# Altium footprint library Wurth_Elektronik_Electromechanic_Wire_to_Board_Connectors_rev16a.PCBLIB: 662 footprints (part 31 of 42)
Each footprint in its own frame and in the unit in brackets; x right, y up, seen from the top. Pads: shape width x height; smd on the part's side, far side on the other; paste and mask are expansions set on the pad; w line width, h text height; cw(c..) or ccw(c..) is an arc to the next point about the centre after c.
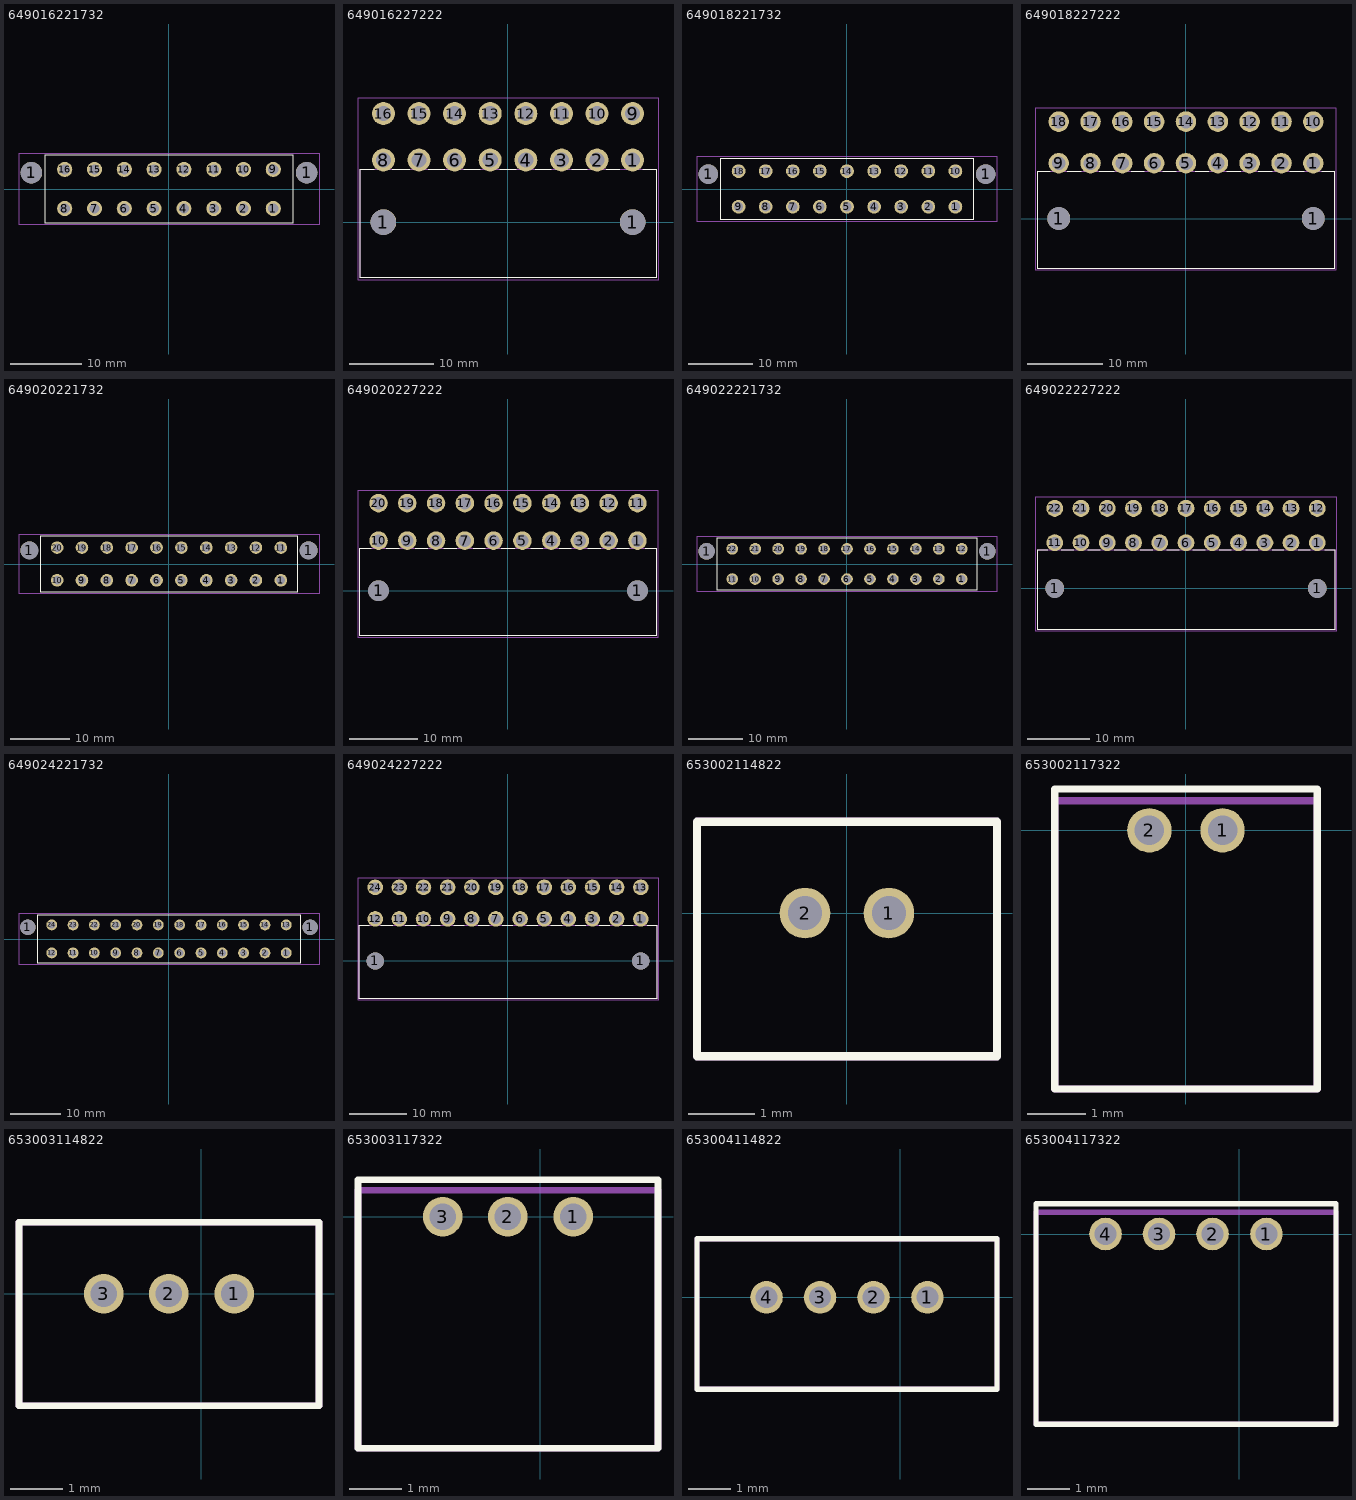
[diagram p30: the footprints below, top view; thin cyan lines are the x and y axes]

## 649016221732 [mil]
pads (18):
  round 119 hole 119: 1(-763.78,91) 1(764,91)
  round 84 hole 56: 1(579,-108.27) 2(414,-108.27) 3(249,-108.27) 4(83,-108.27) 5(-82.68,-108.27) 6(-248.03,-108.27) 7(-413.39,-108.27) 8(-578.74,-108.27) 9(579,109) 10(414,109) 11(249,109) 12(83,109) 13(-82.68,109) 14(-248.03,109) 15(-413.39,109) 16(-578.74,109)
Top Overlay:
  lines w5: -687.01,-188.98 688,-188.98 688,189 -687.01,189 -687.01,-188.98
Mechanical 2:
  text ">NAME" at -54.53,217 h77.5
Mechanical 4:
  text ">VALUE" at -79.53,-249.8 h77.5
Mechanical 16:
  text "1" at 554,-125 h77.5
  text "16" at -611.61,85 h77.5
Mechanical 27:
  lines w5: -832.68,-198.82 833,-198.82 833,199 -832.68,199 -832.68,-198.82

## 649016227222 [mil]
pads (18):
  round 119 hole 119: 1(-578.74,0) 1(579,0)
  round 106.5 hole 71: 1(579,288) 2(414,288) 3(249,288) 4(83,288) 5(-82.68,288) 6(-248.03,288) 7(-413.39,288) 8(-578.74,288) 9(579,504) 10(414,504) 11(249,504) 12(83,504) 13(-82.68,504) 14(-248.03,504) 15(-413.39,504) 16(-578.74,504)
Top Overlay:
  lines w5: -622.05,245 -687.01,245 -687.01,-259.84 688,-259.84 688,245 626,245 ; -537.4,245 -456.69,245 ; -370.08,245 -293.31,245 ; -204.72,245 -129.92,245 ; -37.4,245 38,245 ; 126,245 201,245 ; 296,245 369,245 ; 457,245 520,245
Mechanical 2:
  text ">NAME" at -973.33,-13.19 h77.5
Mechanical 4:
  text ">VALUE" at -998.33,-92.62 h77.5
Mechanical 16:
  lines w5: -687.01,-259.84 688,-259.84 688,245 -687.01,245 -687.01,-259.84
  text "16" at -610.24,471 h77.5
  text "1" at 574,264 h77.5
Mechanical 27:
  lines w5: -696.85,-269.69 697,-269.69 697,577 -696.85,577 -696.85,-269.69

## 649018221732 [mil]
pads (20):
  round 119 hole 119: 1(-846.46,91) 1(847,91)
  round 84 hole 56: 1(662,-108.27) 2(497,-108.27) 3(331,-108.27) 4(166,-108.27) 5(0,-108.27) 6(-165.35,-108.27) 7(-330.71,-108.27) 8(-496.06,-108.27) 9(-661.42,-108.27) 10(662,109) 11(497,109) 12(331,109) 13(166,109) 14(0,109) 15(-165.35,109) 16(-330.71,109) 17(-496.06,109) 18(-661.42,109)
Top Overlay:
  lines w5: -769.68,-188.98 770,-188.98 770,189 -769.68,189 -769.68,-188.98
Mechanical 2:
  text ">NAME" at -171.85,217 h77.5
Mechanical 4:
  text ">VALUE" at -171.85,-274.8 h77.5
Mechanical 16:
  text "1" at 637,-125 h77.5
  text "18" at -713.58,75 h77.5
Mechanical 27:
  lines w5: -915.35,-198.82 916,-198.82 916,199 -915.35,199 -915.35,-198.82

## 649018227222 [mil]
pads (20):
  round 119 hole 119: 1(-661.42,0) 1(662,0)
  round 106.5 hole 71: 1(662,288) 2(497,288) 3(331,288) 4(166,288) 5(0,288) 6(-165.35,288) 7(-330.71,288) 8(-496.06,288) 9(-661.42,288) 10(662,504) 11(497,504) 12(331,504) 13(166,504) 14(0,504) 15(-165.35,504) 16(-330.71,504) 17(-496.06,504) 18(-661.42,504)
Top Overlay:
  lines w5: -704.72,245 -769.68,245 -769.68,-259.84 770,-259.84 770,245 707,245 ; -618.11,245 -543.31,245 ; -450.79,245 -374.02,245 ; -285.43,245 -216.54,245 ; -120.08,245 -49.21,245 ; 48,245 119,245 ; 213,245 284,245 ; 376,245 449,245 ; 540,245 615,245
Mechanical 2:
  text ">NAME" at -1090.65,12 h77.5
Mechanical 4:
  text ">VALUE" at -1090.65,-92.62 h77.5
Mechanical 16:
  lines w5: -769.68,-259.84 770,-259.84 770,245 -769.68,245 -769.68,-259.84
  text "18" at -721.85,471 h77.5
  text "1" at 657,264 h77.5
Mechanical 27:
  lines w5: -779.53,-269.69 780,-269.69 780,577 -779.53,577 -779.53,-269.69

## 649020221732 [mil]
pads (22):
  round 119 hole 119: 1(-929.13,91) 1(930,91)
  round 84 hole 56: 1(745,-108.27) 2(579,-108.27) 3(414,-108.27) 4(249,-108.27) 5(83,-108.27) 6(-82.68,-108.27) 7(-248.03,-108.27) 8(-413.39,-108.27) 9(-578.74,-108.27) 10(-744.09,-108.27) 11(745,109) 12(579,109) 13(414,109) 14(249,109) 15(83,109) 16(-82.68,109) 17(-248.03,109) 18(-413.39,109) 19(-578.74,109) 20(-744.09,109)
Top Overlay:
  lines w5: -852.36,-188.98 853,-188.98 853,189 -852.36,189 -852.36,-188.98
Mechanical 2:
  text ">NAME" at -89.17,217 h77.5
Mechanical 4:
  text ">VALUE" at -89.17,-274.8 h77.5
Mechanical 16:
  text "1" at 720,-125 h77.5
  text "20" at -780.91,75 h77.5
Mechanical 27:
  lines w5: -998.03,-198.82 999,-198.82 999,199 -998.03,199 -998.03,-198.82

## 649020227222 [mil]
pads (22):
  round 119 hole 119: 1(-744.09,0) 1(745,0)
  round 106.5 hole 71: 1(745,288) 2(579,288) 3(414,288) 4(249,288) 5(83,288) 6(-82.68,288) 7(-248.03,288) 8(-413.39,288) 9(-578.74,288) 10(-744.09,288) 11(745,504) 12(579,504) 13(414,504) 14(249,504) 15(83,504) 16(-82.68,504) 17(-248.03,504) 18(-413.39,504) 19(-578.74,504) 20(-744.09,504)
Top Overlay:
  lines w5: -785.43,245 -852.36,245 -852.36,-259.84 853,-259.84 853,245 790,245 ; -698.82,245 -624.02,245 ; -533.46,245 -460.63,245 ; -370.08,245 -293.31,245 ; -200.79,245 -129.92,245 ; -37.4,245 38,245 ; 130,245 199,245 ; 296,245 365,245 ; 459,245 534,245 ; 626,245 697,245
Mechanical 2:
  text ">NAME" at -1232.97,-13.19 h77.5
Mechanical 4:
  text ">VALUE" at -1232.97,-92.62 h77.5
Mechanical 16:
  lines w5: -852.36,-259.84 853,-259.84 853,245 -852.36,245 -852.36,-259.84
  text "20" at -764.17,471 h77.5
  text "1" at 739,264 h77.5
Mechanical 27:
  lines w5: -862.2,-269.69 863,-269.69 863,577 -862.2,577 -862.2,-269.69

## 649022221732 [mil]
pads (24):
  round 119 hole 119: 1(-1011.81,91) 1(1012,91)
  round 84 hole 56: 1(827,-108.27) 2(662,-108.27) 3(497,-108.27) 4(331,-108.27) 5(166,-108.27) 6(0,-108.27) 7(-165.35,-108.27) 8(-330.71,-108.27) 9(-496.06,-108.27) 10(-661.42,-108.27) 11(-826.77,-108.27) 12(827,109) 13(662,109) 14(497,109) 15(331,109) 16(166,109) 17(0,109) 18(-165.35,109) 19(-330.71,109) 20(-496.06,109) 21(-661.42,109) 22(-826.77,109)
Top Overlay:
  lines w5: -935.04,-188.98 936,-188.98 936,189 -935.04,189 -935.04,-188.98
Mechanical 2:
  text ">NAME" at -6.5,217 h77.5
Mechanical 4:
  text ">VALUE" at -6.5,-274.8 h77.5
Mechanical 16:
  text "1" at 802,-125 h77.5
  text "22" at -873.23,75 h77.5
Mechanical 27:
  lines w5: -1080.71,-198.82 1081,-198.82 1081,199 -1080.71,199 -1080.71,-198.82

## 649022227222 [mil]
pads (24):
  round 119 hole 119: 1(-826.77,0) 1(827,0)
  round 106.5 hole 71: 1(827,288) 2(662,288) 3(497,288) 4(331,288) 5(166,288) 6(0,288) 7(-165.35,288) 8(-330.71,288) 9(-496.06,288) 10(-661.42,288) 11(-826.77,288) 12(827,504) 13(662,504) 14(497,504) 15(331,504) 16(166,504) 17(0,504) 18(-165.35,504) 19(-330.71,504) 20(-496.06,504) 21(-661.42,504) 22(-826.77,504)
Top Overlay:
  lines w5: -870.08,245 -935.04,245 -935.04,-259.84 936,-259.84 936,245 873,245 ; -785.43,245 -706.69,245 ; -618.11,245 -539.37,245 ; -452.76,245 -375.98,245 ; -287.4,245 -208.66,245 ; -122.05,245 -43.31,245 ; 44,245 121,245 ; 209,245 286,245 ; 375,245 451,245 ; 542,245 617,245 ; 707,245 782,245
Mechanical 2:
  text ">NAME" at -1250.3,12 h77.5
Mechanical 4:
  text ">VALUE" at -1250.3,-67.62 h77.5
Mechanical 16:
  lines w5: -935.04,-259.84 936,-259.84 936,245 -935.04,245 -935.04,-259.84
  text "22" at -881.5,496 h77.5
  text "1" at 822,264 h77.5
Mechanical 27:
  lines w5: -944.88,-269.69 945,-269.69 945,577 -944.88,577 -944.88,-269.69

## 649024221732 [mil]
pads (26):
  round 119 hole 119: 1(-1094.49,91) 1(1095,91)
  round 84 hole 56: 1(910,-108.27) 2(745,-108.27) 3(579,-108.27) 4(414,-108.27) 5(249,-108.27) 6(83,-108.27) 7(-82.68,-108.27) 8(-248.03,-108.27) 9(-413.39,-108.27) 10(-578.74,-108.27) 11(-744.09,-108.27) 12(-909.45,-108.27) 13(910,109) 14(745,109) 15(579,109) 16(414,109) 17(249,109) 18(83,109) 19(-82.68,109) 20(-248.03,109) 21(-413.39,109) 22(-578.74,109) 23(-744.09,109) 24(-909.45,109)
Top Overlay:
  lines w5: -1017.72,-188.98 1018,-188.98 1018,189 -1017.72,189 -1017.72,-188.98
Mechanical 2:
  text ">NAME" at -148.82,217 h77.5
Mechanical 4:
  text ">VALUE" at -173.82,-274.8 h77.5
Mechanical 16:
  text "1" at 885,-125 h77.5
  text "24" at -940.55,75 h77.5
Mechanical 27:
  lines w5: -1163.39,-198.82 1164,-198.82 1164,199 -1163.39,199 -1163.39,-198.82

## 649024227222 [mil]
pads (26):
  round 119 hole 119: 1(-909.45,0) 1(910,0)
  round 106.5 hole 71: 1(910,288) 2(745,288) 3(579,288) 4(414,288) 5(249,288) 6(83,288) 7(-82.68,288) 8(-248.03,288) 9(-413.39,288) 10(-578.74,288) 11(-744.09,288) 12(-909.45,288) 13(910,504) 14(745,504) 15(579,504) 16(414,504) 17(249,504) 18(83,504) 19(-82.68,504) 20(-248.03,504) 21(-413.39,504) 22(-578.74,504) 23(-744.09,504) 24(-909.45,504)
Top Overlay:
  lines w5: -950.79,245 -1017.72,245 -1017.72,-259.84 1018,-259.84 1018,245 ; -870.08,245 -789.37,245 ; -702.76,245 -627.95,245 ; -529.53,245 -464.57,245 ; -372.05,245 -299.21,245 ; -202.76,245 -127.95,245 ; -39.37,245 34,245 ; 128,245 203,245 ; 294,245 371,245 ; 461,245 534,245 ; 625,245 699,245 ; 788,245 859,245 ; 953,245 1016,245
Mechanical 2:
  text ">NAME" at -1317.62,12 h77.5
Mechanical 4:
  text ">VALUE" at -1317.62,-67.62 h77.5
Mechanical 16:
  lines w5: -1017.72,-259.84 1018,-259.84 1018,245 -1017.72,245 -1017.72,-259.84
  text "24" at -923.82,471 h77.5
  text "1" at 905,258 h77.5
Mechanical 27:
  lines w5: -1027.56,-269.69 1028,-269.69 1028,571 -1027.56,571 -1027.56,-269.69

## 653002114822 [mil]
pads (2):
  round 30 hole 20: 1(25,0) 2(-24.61,0)
Top Overlay:
  lines w5: -88.58,-84.65 89,-84.65 89,54 -88.58,54 -88.58,-84.65
Mechanical 2:
  text ">NAME" at 153,-4.92 h77.5
Mechanical 4:
  text ">VALUE" at 153,-63.98 h77.5
Mechanical 16:
  lines w5: -88.58,-84.65 89,-84.65 89,54 -88.58,54 -88.58,-84.65
  text "1" at 13,-12.3 h49.6
  text "2" at -36.91,-12.3 h49.6

## 653002117322 [mil]
pads (2):
  round 30 hole 20: 1(25,0) 2(-24.61,0)
Top Overlay:
  lines w5: -88.58,-175.2 89,-175.2 89,28 -88.58,28 -88.58,-175.2
Mechanical 2:
  text ">NAME" at 153,-4.92 h77.5
Mechanical 4:
  text ">VALUE" at 153,-63.98 h77.5
Mechanical 16:
  lines w5: -88.58,-175.2 89,-175.2 89,20 -88.58,20 -88.58,-175.2
  text "1" at 13,-12.3 h49.6
  text "2" at -36.91,-12.3 h49.6

## 653003114822 [mil]
pads (3):
  round 30 hole 20: 1(25,0) 2(-24.61,0) 3(-73.82,0)
Top Overlay:
  lines w5: -137.8,-84.65 89,-84.65 89,54 -137.8,54 -137.8,-84.65
Mechanical 2:
  text ">NAME" at 153,-4.92 h77.5
Mechanical 4:
  text ">VALUE" at 153,-63.98 h77.5
Mechanical 16:
  lines w5: -137.8,-84.65 89,-84.65 89,54 -137.8,54 -137.8,-84.65
  text "1" at 13,-12.3 h49.6
  text "3" at -86.12,-12.3 h49.6

## 653003117322 [mil]
pads (3):
  round 30 hole 20: 1(25,0) 2(-24.61,0) 3(-73.82,0)
Top Overlay:
  lines w5: -137.8,-175.2 89,-175.2 89,28 -137.8,28 -137.8,-175.2
Mechanical 2:
  text ">NAME" at 153,-4.92 h77.5
Mechanical 4:
  text ">VALUE" at 153,-63.98 h77.5
Mechanical 16:
  lines w5: -137.8,-175.2 89,-175.2 89,20 -137.8,20 -137.8,-175.2
  text "1" at 13,-12.3 h49.6
  text "3" at -86.12,-12.3 h49.6

## 653004114822 [mil]
pads (4):
  round 30 hole 20: 1(25,0) 2(-24.61,0) 3(-73.82,0) 4(-123.03,0)
Top Overlay:
  lines w5: -187.01,-84.65 89,-84.65 89,54 -187.01,54 -187.01,-84.65
Mechanical 2:
  text ">NAME" at 153,-4.92 h77.5
Mechanical 4:
  text ">VALUE" at 153,-63.98 h77.5
Mechanical 16:
  lines w5: -187.01,-84.65 89,-84.65 89,54 -187.01,54 -187.01,-84.65
  text "1" at 13,-12.3 h49.6
  text "4" at -135.33,-12.3 h49.6

## 653004117322 [mil]
pads (4):
  round 30 hole 20: 1(25,0) 2(-24.61,0) 3(-73.82,0) 4(-123.03,0)
Top Overlay:
  lines w5: -187.01,-175.2 89,-175.2 89,28 -187.01,28 -187.01,-175.2
Mechanical 2:
  text ">NAME" at 153,-4.92 h77.5
Mechanical 4:
  text ">VALUE" at 153,-63.98 h77.5
Mechanical 16:
  lines w5: -187.01,-175.2 89,-175.2 89,20 -187.01,20 -187.01,-175.2
  text "1" at 13,-12.3 h49.6
  text "4" at -135.33,-12.3 h49.6